# Altium footprint library Basal.PcbLib: 248 footprints (part 11 of 16)
Each footprint in its own frame and in the unit in brackets; x right, y up, seen from the top. Pads: shape width x height; smd on the part's side, far side on the other; paste and mask are expansions set on the pad; w line width, h text height; cw(c..) or ccw(c..) is an arc to the next point about the centre after c.
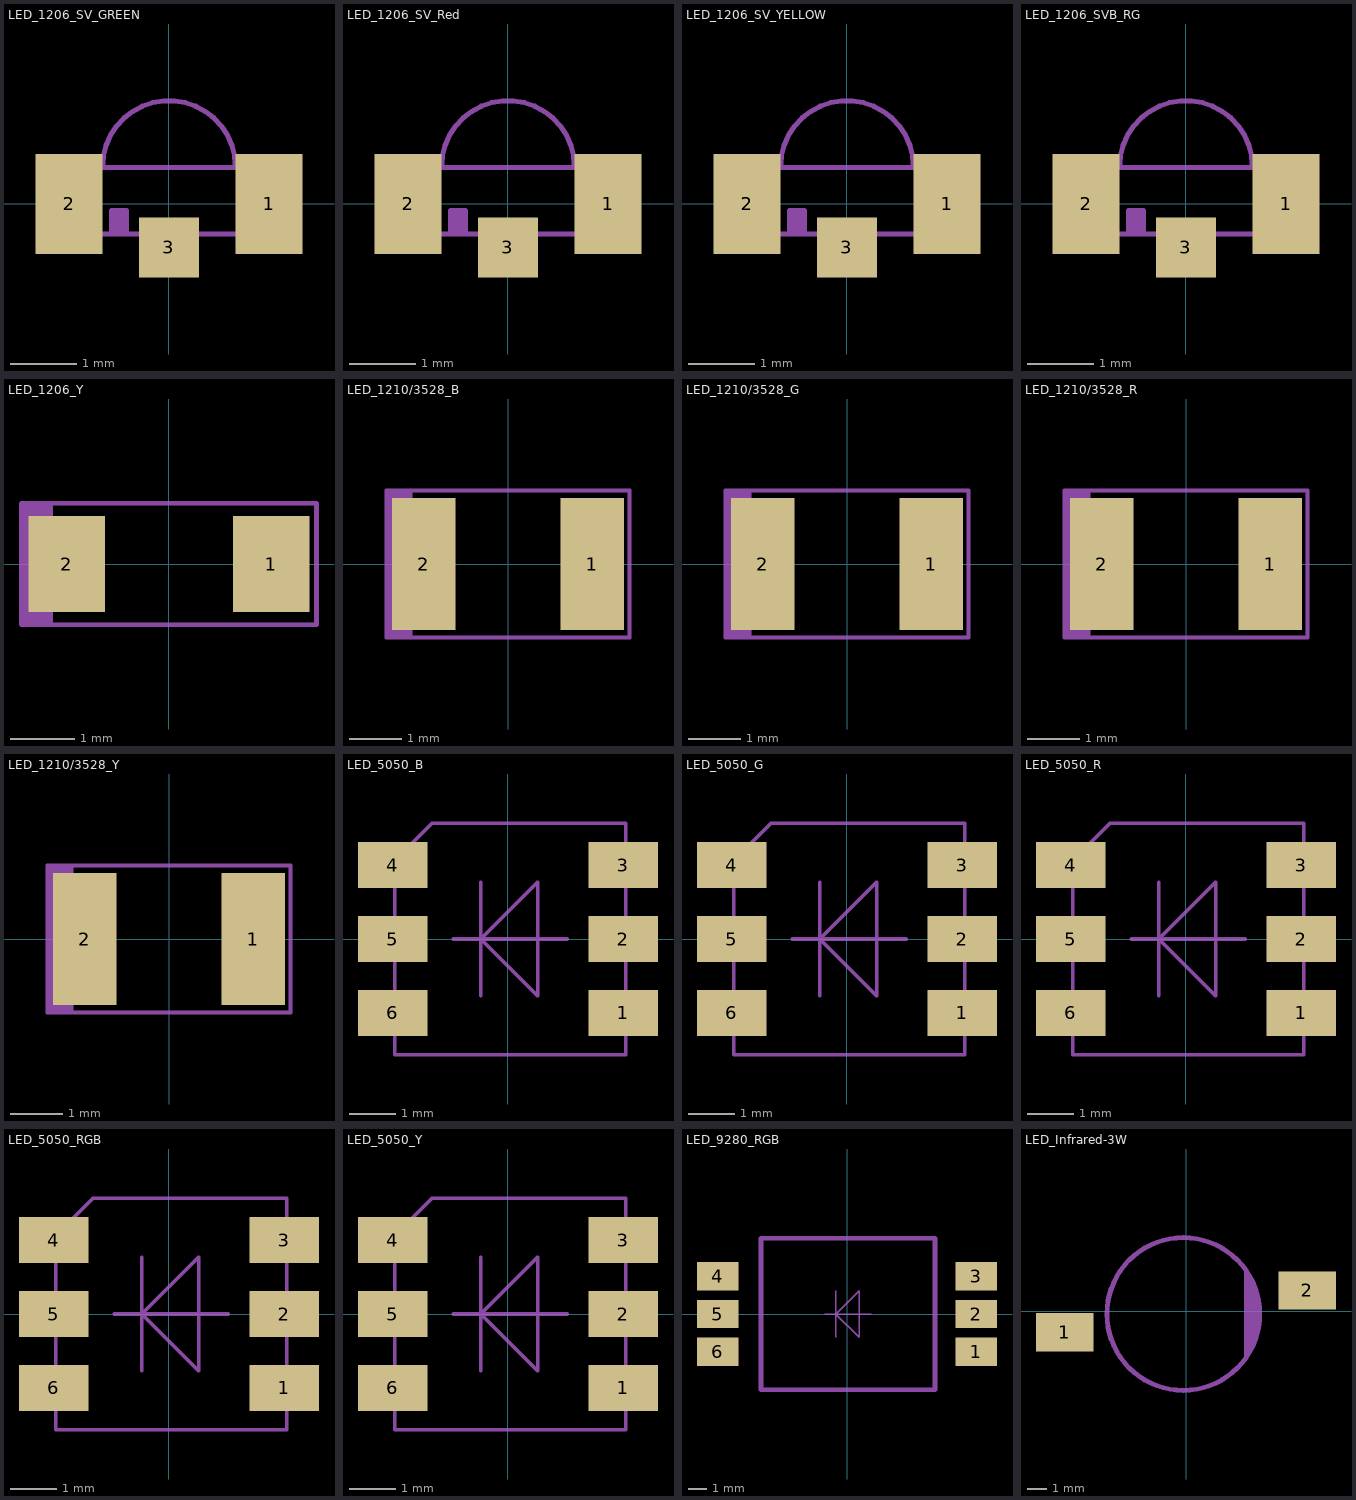
[diagram p10: the footprints below, top view; thin cyan lines are the x and y axes]

## LED_1206_SV_GREEN [mm]
pads (3):
  rect 1x1.5 smd: 1(1.5,0) 2(-1.5,0)
  rect 0.9x0.9 smd: 3(0,-0.65)
Mechanical 15:
  lines w0.076: -1,0.55 cw(c0,0.55) 1,0.55 ; -0.787,-0.406 -0.787,-0.102 ; -0.711,-0.406 -0.711,-0.102 ; -1.5,-0.45 -1.5,0.55 1.5,0.55 1.5,-0.45 -1.5,-0.45 ; -0.864,-0.406 -0.864,-0.102 -0.635,-0.102 -0.635,-0.406 -0.864,-0.406
3D body "LED 1206SV GREEN.STEP": height 0.98, standoff -0.01, extent -1.5,-0.456 1.5,1.544

## LED_1206_SV_Red [mm]
pads (3):
  rect 1x1.5 smd: 1(1.5,0) 2(-1.5,0)
  rect 0.9x0.9 smd: 3(0,-0.65)
Mechanical 15:
  lines w0.076: -1,0.55 cw(c0,0.55) 1,0.55 ; -0.787,-0.406 -0.787,-0.102 ; -0.711,-0.406 -0.711,-0.102 ; -1.5,-0.45 -1.5,0.55 1.5,0.55 1.5,-0.45 -1.5,-0.45 ; -0.864,-0.406 -0.864,-0.102 -0.635,-0.102 -0.635,-0.406 -0.864,-0.406
3D body "LED 1206SV RED.STEP": height 0.98, standoff -0.01, extent -1.5,-0.456 1.5,1.544

## LED_1206_SV_YELLOW [mm]
pads (3):
  rect 1x1.5 smd: 1(1.5,0) 2(-1.5,0)
  rect 0.9x0.9 smd: 3(0,-0.65)
Mechanical 15:
  lines w0.076: -1,0.55 cw(c0,0.55) 1,0.55 ; -0.787,-0.406 -0.787,-0.102 ; -0.711,-0.406 -0.711,-0.102 ; -1.5,-0.45 1.5,-0.45 1.5,0.55 -1.5,0.55 -1.5,-0.45 ; -0.864,-0.406 -0.635,-0.406 -0.635,-0.102 -0.864,-0.102 -0.864,-0.406
3D body "LED 1206SV YELLOW.STEP": height 0.98, standoff -0.01, extent -1.5,-0.456 1.5,1.544

## LED_1206_SVB_RG [mm]
pads (3):
  rect 1x1.5 smd: 1(1.5,0) 2(-1.5,0)
  rect 0.9x0.9 smd: 3(0,-0.65)
Mechanical 15:
  lines w0.076: -1,0.55 cw(c0,0.55) 1,0.55 ; -0.787,-0.406 -0.787,-0.102 ; -0.711,-0.406 -0.711,-0.102 ; -1.5,-0.45 1.5,-0.45 1.5,0.55 -1.5,0.55 -1.5,-0.45 ; -0.864,-0.406 -0.635,-0.406 -0.635,-0.102 -0.864,-0.102 -0.864,-0.406
3D body "LED 1206SV GREEN.STEP": height 0.98, standoff -0.01, extent -1.5,-0.456 1.5,1.544

## LED_1206_Y [mm] "黄色贴片1206LED"
height 0.55
pads (2):
  rect 1.2x1.5 smd paste-3: 1(1.6,0) 2(-1.6,0)
Top Paste:
  region: -1.051,-0.611 -1.051,-0.631 -1.066,-0.668 -1.094,-0.696 -1.131,-0.711 -1.151,-0.711 -2.049,-0.711 -2.069,-0.711 -2.106,-0.696 -2.134,-0.668 -2.149,-0.631 -2.149,-0.611 -2.149,0.611 -2.149,0.631 -2.134,0.668 -2.106,0.696 -2.069,0.711 -2.049,0.711 -1.151,0.711 -1.131,0.711 -1.094,0.696 -1.066,0.668 -1.051,0.631 -1.051,0.611 -1.051,0.35 -1.051,0.33 -1.066,0.293 -1.094,0.265 -1.131,0.25 -1.151,0.25 -1.25,0.25 -1.299,0.245 -1.389,0.208 -1.458,0.139 -1.495,0.049 -1.495,-0.049 -1.458,-0.139 -1.389,-0.208 -1.299,-0.245 -1.25,-0.25 -1.151,-0.25 -1.131,-0.25 -1.094,-0.265 -1.066,-0.293 -1.051,-0.33 -1.051,-0.35
  region: 1.051,0.611 1.051,0.631 1.066,0.668 1.094,0.696 1.131,0.711 1.151,0.711 2.049,0.711 2.069,0.711 2.106,0.696 2.134,0.668 2.149,0.631 2.149,0.611 2.149,-0.611 2.149,-0.631 2.134,-0.668 2.106,-0.696 2.069,-0.711 2.049,-0.711 1.151,-0.711 1.131,-0.711 1.094,-0.696 1.066,-0.668 1.051,-0.631 1.051,-0.611 1.051,-0.35 1.051,-0.33 1.066,-0.293 1.094,-0.265 1.131,-0.25 1.151,-0.25 1.25,-0.25 1.299,-0.245 1.389,-0.208 1.458,-0.139 1.495,-0.049 1.495,0.049 1.458,0.139 1.389,0.208 1.299,0.245 1.25,0.25 1.151,0.25 1.131,0.25 1.094,0.265 1.066,0.293 1.051,0.33 1.051,0.35
Mechanical 15:
  lines w0.076: -2.235,-0.953 -2.235,0.953 ; -2.159,-0.953 -2.159,0.953 ; -2.083,-0.953 -2.083,0.953 ; -2.007,-0.953 -2.007,0.953 ; -1.93,-0.953 -1.93,0.953 ; -1.854,-0.953 -1.854,0.953 ; -2.311,-0.953 -2.311,0.953 2.311,0.953 2.311,-0.953 -2.311,-0.953
3D body "LED 1206 YELLOW.STEP": height 1.1, standoff 0, extent -1.6,-0.8 1.6,0.8

## LED_1210/3528_B [mm] "蓝色贴片1210/3528LED"
height 0.5
pads (2):
  rect 1.2x2.5 smd paste-3: 1(1.6,0) 2(-1.6,0)
Top Paste:
  region: -1.057,-1.1 -1.057,-1.12 -1.072,-1.157 -1.1,-1.185 -1.137,-1.2 -1.157,-1.2 -2.057,-1.2 -2.077,-1.2 -2.114,-1.185 -2.142,-1.157 -2.157,-1.12 -2.157,-1.1 -2.157,1.1 -2.157,1.12 -2.142,1.157 -2.114,1.185 -2.077,1.2 -2.057,1.2 -1.157,1.2 -1.137,1.2 -1.1,1.185 -1.072,1.157 -1.057,1.12 -1.057,1.1 -1.057,0.5 -1.057,0.48 -1.072,0.443 -1.1,0.415 -1.137,0.4 -1.157,0.4 -1.235,0.392 -1.379,0.333 -1.49,0.222 -1.549,0.078 -1.549,-0.078 -1.49,-0.222 -1.379,-0.333 -1.235,-0.392 -1.157,-0.4 -1.137,-0.4 -1.1,-0.415 -1.072,-0.443 -1.057,-0.48 -1.057,-0.5
  region: 1.057,1.1 1.057,1.12 1.072,1.157 1.1,1.185 1.137,1.2 1.157,1.2 2.057,1.2 2.077,1.2 2.114,1.185 2.142,1.157 2.157,1.12 2.157,1.1 2.157,-1.1 2.157,-1.12 2.142,-1.157 2.114,-1.185 2.077,-1.2 2.057,-1.2 1.157,-1.2 1.137,-1.2 1.1,-1.185 1.072,-1.157 1.057,-1.12 1.057,-1.1 1.057,-0.5 1.057,-0.48 1.072,-0.443 1.1,-0.415 1.137,-0.4 1.157,-0.4 1.235,-0.392 1.379,-0.333 1.49,-0.222 1.549,-0.078 1.549,0.078 1.49,0.222 1.379,0.333 1.235,0.392 1.157,0.4 1.137,0.4 1.1,0.415 1.072,0.443 1.057,0.48 1.057,0.5
Mechanical 15:
  lines w0.076: -2.235,-1.397 -2.235,1.397 ; -2.159,-1.397 -2.159,1.397 ; -2.083,-1.397 -2.083,1.397 ; -2.007,-1.397 -2.007,1.397 ; -1.93,-1.397 -1.93,1.397 ; -1.854,-1.397 -1.854,1.397 ; -2.311,-1.397 2.311,-1.397 2.311,1.397 -2.311,1.397 -2.311,-1.397
3D body "BLUE3528.STEP": height 1.81, standoff 0.01, extent -1.75,-1.4 1.75,1.4

## LED_1210/3528_G [mm] "绿色贴片1210/3528LED"
height 0.5
pads (2):
  rect 1.2x2.5 smd paste-3: 1(1.6,0) 2(-1.6,0)
Top Paste:
  region: -1.057,-1.1 -1.057,-1.12 -1.072,-1.157 -1.1,-1.185 -1.137,-1.2 -1.157,-1.2 -2.057,-1.2 -2.077,-1.2 -2.114,-1.185 -2.142,-1.157 -2.157,-1.12 -2.157,-1.1 -2.157,1.1 -2.157,1.12 -2.142,1.157 -2.114,1.185 -2.077,1.2 -2.057,1.2 -1.157,1.2 -1.137,1.2 -1.1,1.185 -1.072,1.157 -1.057,1.12 -1.057,1.1 -1.057,0.5 -1.057,0.48 -1.072,0.443 -1.1,0.415 -1.137,0.4 -1.157,0.4 -1.235,0.392 -1.379,0.333 -1.49,0.222 -1.549,0.078 -1.549,-0.078 -1.49,-0.222 -1.379,-0.333 -1.235,-0.392 -1.157,-0.4 -1.137,-0.4 -1.1,-0.415 -1.072,-0.443 -1.057,-0.48 -1.057,-0.5
  region: 1.057,1.1 1.057,1.12 1.072,1.157 1.1,1.185 1.137,1.2 1.157,1.2 2.057,1.2 2.077,1.2 2.114,1.185 2.142,1.157 2.157,1.12 2.157,1.1 2.157,-1.1 2.157,-1.12 2.142,-1.157 2.114,-1.185 2.077,-1.2 2.057,-1.2 1.157,-1.2 1.137,-1.2 1.1,-1.185 1.072,-1.157 1.057,-1.12 1.057,-1.1 1.057,-0.5 1.057,-0.48 1.072,-0.443 1.1,-0.415 1.137,-0.4 1.157,-0.4 1.235,-0.392 1.379,-0.333 1.49,-0.222 1.549,-0.078 1.549,0.078 1.49,0.222 1.379,0.333 1.235,0.392 1.157,0.4 1.137,0.4 1.1,0.415 1.072,0.443 1.057,0.48 1.057,0.5
Mechanical 15:
  lines w0.076: -2.235,-1.397 -2.235,1.397 ; -2.159,-1.397 -2.159,1.397 ; -2.083,-1.397 -2.083,1.397 ; -2.007,-1.397 -2.007,1.397 ; -1.93,-1.397 -1.93,1.397 ; -1.854,-1.397 -1.854,1.397 ; -2.311,-1.397 -2.311,1.397 2.311,1.397 2.311,-1.397 -2.311,-1.397
3D body "GREEN 3528.STEP": height 1.81, standoff 0.01, extent -1.75,-1.4 1.75,1.4

## LED_1210/3528_R [mm] "红色贴片1210/3528LED"
height 0.5
pads (2):
  rect 1.2x2.5 smd paste-3: 1(1.6,0) 2(-1.6,0)
Top Paste:
  region: -1.057,-1.1 -1.057,-1.12 -1.072,-1.157 -1.1,-1.185 -1.137,-1.2 -1.157,-1.2 -2.057,-1.2 -2.077,-1.2 -2.114,-1.185 -2.142,-1.157 -2.157,-1.12 -2.157,-1.1 -2.157,1.1 -2.157,1.12 -2.142,1.157 -2.114,1.185 -2.077,1.2 -2.057,1.2 -1.157,1.2 -1.137,1.2 -1.1,1.185 -1.072,1.157 -1.057,1.12 -1.057,1.1 -1.057,0.5 -1.057,0.48 -1.072,0.443 -1.1,0.415 -1.137,0.4 -1.157,0.4 -1.235,0.392 -1.379,0.333 -1.49,0.222 -1.549,0.078 -1.549,-0.078 -1.49,-0.222 -1.379,-0.333 -1.235,-0.392 -1.157,-0.4 -1.137,-0.4 -1.1,-0.415 -1.072,-0.443 -1.057,-0.48 -1.057,-0.5
  region: 1.057,1.1 1.057,1.12 1.072,1.157 1.1,1.185 1.137,1.2 1.157,1.2 2.057,1.2 2.077,1.2 2.114,1.185 2.142,1.157 2.157,1.12 2.157,1.1 2.157,-1.1 2.157,-1.12 2.142,-1.157 2.114,-1.185 2.077,-1.2 2.057,-1.2 1.157,-1.2 1.137,-1.2 1.1,-1.185 1.072,-1.157 1.057,-1.12 1.057,-1.1 1.057,-0.5 1.057,-0.48 1.072,-0.443 1.1,-0.415 1.137,-0.4 1.157,-0.4 1.235,-0.392 1.379,-0.333 1.49,-0.222 1.549,-0.078 1.549,0.078 1.49,0.222 1.379,0.333 1.235,0.392 1.157,0.4 1.137,0.4 1.1,0.415 1.072,0.443 1.057,0.48 1.057,0.5
Mechanical 15:
  lines w0.076: -2.235,-1.397 -2.235,1.397 ; -2.159,-1.397 -2.159,1.397 ; -2.083,-1.397 -2.083,1.397 ; -2.007,-1.397 -2.007,1.397 ; -1.93,-1.397 -1.93,1.397 ; -1.854,-1.397 -1.854,1.397 ; -2.311,-1.397 -2.311,1.397 2.311,1.397 2.311,-1.397 -2.311,-1.397
3D body "RED 3528.STEP": height 1.81, standoff 0.01, extent -1.75,-1.4 1.75,1.4

## LED_1210/3528_Y [mm] "黄色贴片1210/3528LED"
height 0.5
pads (2):
  rect 1.2x2.5 smd paste-3: 1(1.6,0) 2(-1.6,0)
Top Paste:
  region: -1.057,-1.1 -1.057,-1.12 -1.072,-1.157 -1.1,-1.185 -1.137,-1.2 -1.157,-1.2 -2.057,-1.2 -2.077,-1.2 -2.114,-1.185 -2.142,-1.157 -2.157,-1.12 -2.157,-1.1 -2.157,1.1 -2.157,1.12 -2.142,1.157 -2.114,1.185 -2.077,1.2 -2.057,1.2 -1.157,1.2 -1.137,1.2 -1.1,1.185 -1.072,1.157 -1.057,1.12 -1.057,1.1 -1.057,0.5 -1.057,0.48 -1.072,0.443 -1.1,0.415 -1.137,0.4 -1.157,0.4 -1.235,0.392 -1.379,0.333 -1.49,0.222 -1.549,0.078 -1.549,-0.078 -1.49,-0.222 -1.379,-0.333 -1.235,-0.392 -1.157,-0.4 -1.137,-0.4 -1.1,-0.415 -1.072,-0.443 -1.057,-0.48 -1.057,-0.5
  region: 1.057,1.1 1.057,1.12 1.072,1.157 1.1,1.185 1.137,1.2 1.157,1.2 2.057,1.2 2.077,1.2 2.114,1.185 2.142,1.157 2.157,1.12 2.157,1.1 2.157,-1.1 2.157,-1.12 2.142,-1.157 2.114,-1.185 2.077,-1.2 2.057,-1.2 1.157,-1.2 1.137,-1.2 1.1,-1.185 1.072,-1.157 1.057,-1.12 1.057,-1.1 1.057,-0.5 1.057,-0.48 1.072,-0.443 1.1,-0.415 1.137,-0.4 1.157,-0.4 1.235,-0.392 1.379,-0.333 1.49,-0.222 1.549,-0.078 1.549,0.078 1.49,0.222 1.379,0.333 1.235,0.392 1.157,0.4 1.137,0.4 1.1,0.415 1.072,0.443 1.057,0.48 1.057,0.5
Mechanical 15:
  lines w0.076: -2.235,-1.397 -2.235,1.397 ; -2.159,-1.397 -2.159,1.397 ; -2.083,-1.397 -2.083,1.397 ; -2.007,-1.397 -2.007,1.397 ; -1.93,-1.397 -1.93,1.397 ; -1.854,-1.397 -1.854,1.397 ; -2.311,-1.397 -2.311,1.397 2.311,1.397 2.311,-1.397 -2.311,-1.397
3D body "YELLOW 3528.STEP": height 1.81, standoff 0.01, extent -1.75,-1.4 1.75,1.4

## LED_5050_B [mm] "5050封装蓝色LED"
pads (6):
  rect 1.5x1 smd: 1(2.495,-1.6) 2(2.495,0) 3(2.495,1.6) 4(-2.495,1.6) 5(-2.495,0) 6(-2.495,-1.6)
Mechanical 15:
  lines w0.076: -1.187,0 1.277,0 ; -0.59,-1.232 -0.59,1.232 ; -2.455,-2.5 -2.455,1.702 -2.449,1.702 -1.651,2.5 2.545,2.5 2.545,-2.5 -2.455,-2.5 ; -0.59,0 0.642,1.232 0.642,-1.232 -0.59,0
3D body "BLUE 5050.STEP": height 1.6, standoff 0, extent -2.605,-2.5 2.695,2.5

## LED_5050_G [mm] "5050封装绿色LED"
pads (6):
  rect 1.5x1 smd: 1(2.495,-1.6) 2(2.495,0) 3(2.495,1.6) 4(-2.495,1.6) 5(-2.495,0) 6(-2.495,-1.6)
Mechanical 15:
  lines w0.076: -1.187,0 1.277,0 ; -0.59,-1.232 -0.59,1.232 ; -2.455,-2.5 -2.455,1.702 -2.449,1.702 -1.651,2.5 2.545,2.5 2.545,-2.5 -2.455,-2.5 ; -0.59,0 0.642,1.232 0.642,-1.232 -0.59,0
3D body "GREEN 5050 .STEP": height 1.6, standoff 0, extent -2.605,-2.5 2.695,2.5

## LED_5050_R [mm] "5050封装红色LED"
pads (6):
  rect 1.5x1 smd: 1(2.495,-1.6) 2(2.495,0) 3(2.495,1.6) 4(-2.495,1.6) 5(-2.495,0) 6(-2.495,-1.6)
Mechanical 15:
  lines w0.076: -1.187,0 1.277,0 ; -0.59,-1.232 -0.59,1.232 ; -2.455,-2.5 -2.455,1.702 -2.449,1.702 -1.651,2.5 2.545,2.5 2.545,-2.5 -2.455,-2.5 ; -0.59,0 0.642,1.232 0.642,-1.232 -0.59,0
3D body "RED 5050.STEP": height 1.6, standoff 0, extent -2.605,-2.5 2.695,2.5

## LED_5050_RGB [mm] "5050封装3色LED"
pads (6):
  rect 1.5x1 smd: 1(2.495,-1.6) 2(2.495,0) 3(2.495,1.6) 4(-2.495,1.6) 5(-2.495,0) 6(-2.495,-1.6)
Mechanical 15:
  lines w0.076: -1.187,0 1.277,0 ; -0.59,-1.232 -0.59,1.232 ; -2.455,-2.5 -2.455,1.702 -2.449,1.702 -1.651,2.5 2.545,2.5 2.545,-2.5 -2.455,-2.5 ; -0.59,0 0.642,1.232 0.642,-1.232 -0.59,0
3D body "smd_led_5050.STEP": height 1.6, standoff 0, extent -2.605,-2.5 2.695,2.5

## LED_5050_Y [mm] "5050封装黄色LED"
pads (6):
  rect 1.5x1 smd: 1(2.495,-1.6) 2(2.495,0) 3(2.495,1.6) 4(-2.495,1.6) 5(-2.495,0) 6(-2.495,-1.6)
Mechanical 15:
  lines w0.076: -1.187,0 1.277,0 ; -0.59,-1.232 -0.59,1.232 ; -2.455,-2.5 -2.455,1.702 -2.449,1.702 -1.651,2.5 2.545,2.5 2.545,-2.5 -2.455,-2.5 ; -0.59,0 0.642,-1.232 0.642,1.232 -0.59,0
3D body "smd_led_5050.STEP": height 1.6, standoff 0, extent -2.605,-2.5 2.695,2.5

## LED_9280_RGB [mm] "5050封装3色LED"
pads (6):
  rect 2.2x1.5 smd: 1(6.825,-2) 2(6.825,0) 3(6.825,2) 4(-6.825,2) 5(-6.825,0) 6(-6.825,-2)
Mechanical 15:
  lines w0.076: -1.187,0 1.277,0 ; -0.59,-1.232 -0.59,1.232 ; -0.59,0 0.642,-1.232 0.642,1.232 -0.59,0
  lines w0.254: -4.55,-4 -4.55,4 4.65,4 4.65,-4 -4.55,-4
3D body: height 1.5, standoff 1.1, extent -6.256,1.41 -4.047,2.591
3D body: height 0.4, standoff 0, extent -7.35,1.302 -5.85,2.699
3D body: height 1.5, standoff 0, extent -6.256,1.41 -5.85,2.591
3D body: height 1.5, standoff 1.1, extent -6.256,-0.59 -4.047,0.59
3D body: height 0.4, standoff 0, extent -7.35,-0.699 -5.85,0.699
3D body: height 1.5, standoff 0, extent -6.256,-0.59 -5.85,0.59
3D body: height 1.5, standoff 1.1, extent -6.256,-2.591 -4.047,-1.41
3D body: height 0.4, standoff 0, extent -7.35,-2.699 -5.85,-1.302
3D body: height 1.5, standoff 0, extent -6.256,-2.591 -5.85,-1.41
3D body: height 1.5, standoff 1.1, extent 4.047,1.41 6.256,2.591
3D body: height 0.4, standoff 0, extent 5.85,1.302 7.35,2.699
3D body: height 1.5, standoff 0, extent 5.85,1.41 6.256,2.591
3D body: height 1.5, standoff 1.1, extent 4.047,-0.59 6.256,0.59
3D body: height 0.4, standoff 0, extent 5.85,-0.699 7.35,0.699
3D body: height 1.5, standoff 0, extent 5.85,-0.59 6.256,0.59
3D body: height 1.5, standoff 0, extent 5.85,-2.591 6.256,-1.41
3D body: height 0.4, standoff 0, extent 5.85,-2.699 7.35,-1.302
3D body: height 1.5, standoff 1.1, extent 4.047,-2.591 6.256,-1.41
3D body: height 2.37, standoff 0.1, extent -2.422,-1.092 -0.222,1.107
3D body: height 2.37, standoff 0.1, extent -0.245,0.069 1.955,2.268
3D body: height 2.37, standoff 0.1, extent -0.237,-2.243 1.963,-0.043
3D body: height 2.36, standoff 0.1, extent -2.55,-2.599 2.65,2.599
3D body: height 2.25, standoff 0.1, extent -4.547,-4.013 4.647,4.013

## LED_Infrared-3W [mm] "直插5MMLED_黄色"
pads (2):
  rect 3x2 smd: 1(-6.352,-1.092) 2(6.352,1.092)
Mechanical 15:
  circle w0.254: c-0.14,-0.14 r4
  lines w0.254: 3.175,-2.362 3.175,2.083 ; 3.404,-1.981 3.404,1.702 ; 3.658,-1.397 3.658,1.118
  text "+" at -7.052,-0.178 h3.05
  text "-" at 5.658,-1.854 h3.05
3D body: height 1.51, standoff 1.2, extent 3.797,-1.797 4.204,-0.616
3D body: height 1.5, standoff 0, extent -5.743,-1.664 -5.336,-0.483
3D body: height 0.4, standoff 0, extent -7.368,-1.791 -5.336,-0.394
3D body: height 1.5, standoff 1.1, extent -4.178,-1.664 -2.934,1.384
3D body: height 1.5, standoff 1.1, extent 2.654,-1.962 4.305,1.683
3D body: height 2.6, standoff 0, extent -4.14,-4.139 3.86,3.859
3D body: height 6, standoff 0.4, extent -2.938,-2.939 2.659,2.66
3D body: height 1.5, standoff 1.1, extent -5.743,-1.664 -3.533,-0.483
3D body: height 1.5, standoff 1.1, extent 3.533,0.502 5.743,1.683
3D body: height 0.4, standoff 0, extent 5.336,0.394 7.368,1.791
3D body: height 1.5, standoff 0, extent 5.336,0.502 5.743,1.683